# Altium footprint library 6-Connectors-3.PcbLib: 153 footprints (part 1 of 11)
Each footprint in its own frame and in the unit in brackets; x right, y up, seen from the top. Pads: shape width x height; smd on the part's side, far side on the other; paste and mask are expansions set on the pad; w line width, h text height; cw(c..) or ccw(c..) is an arc to the next point about the centre after c.
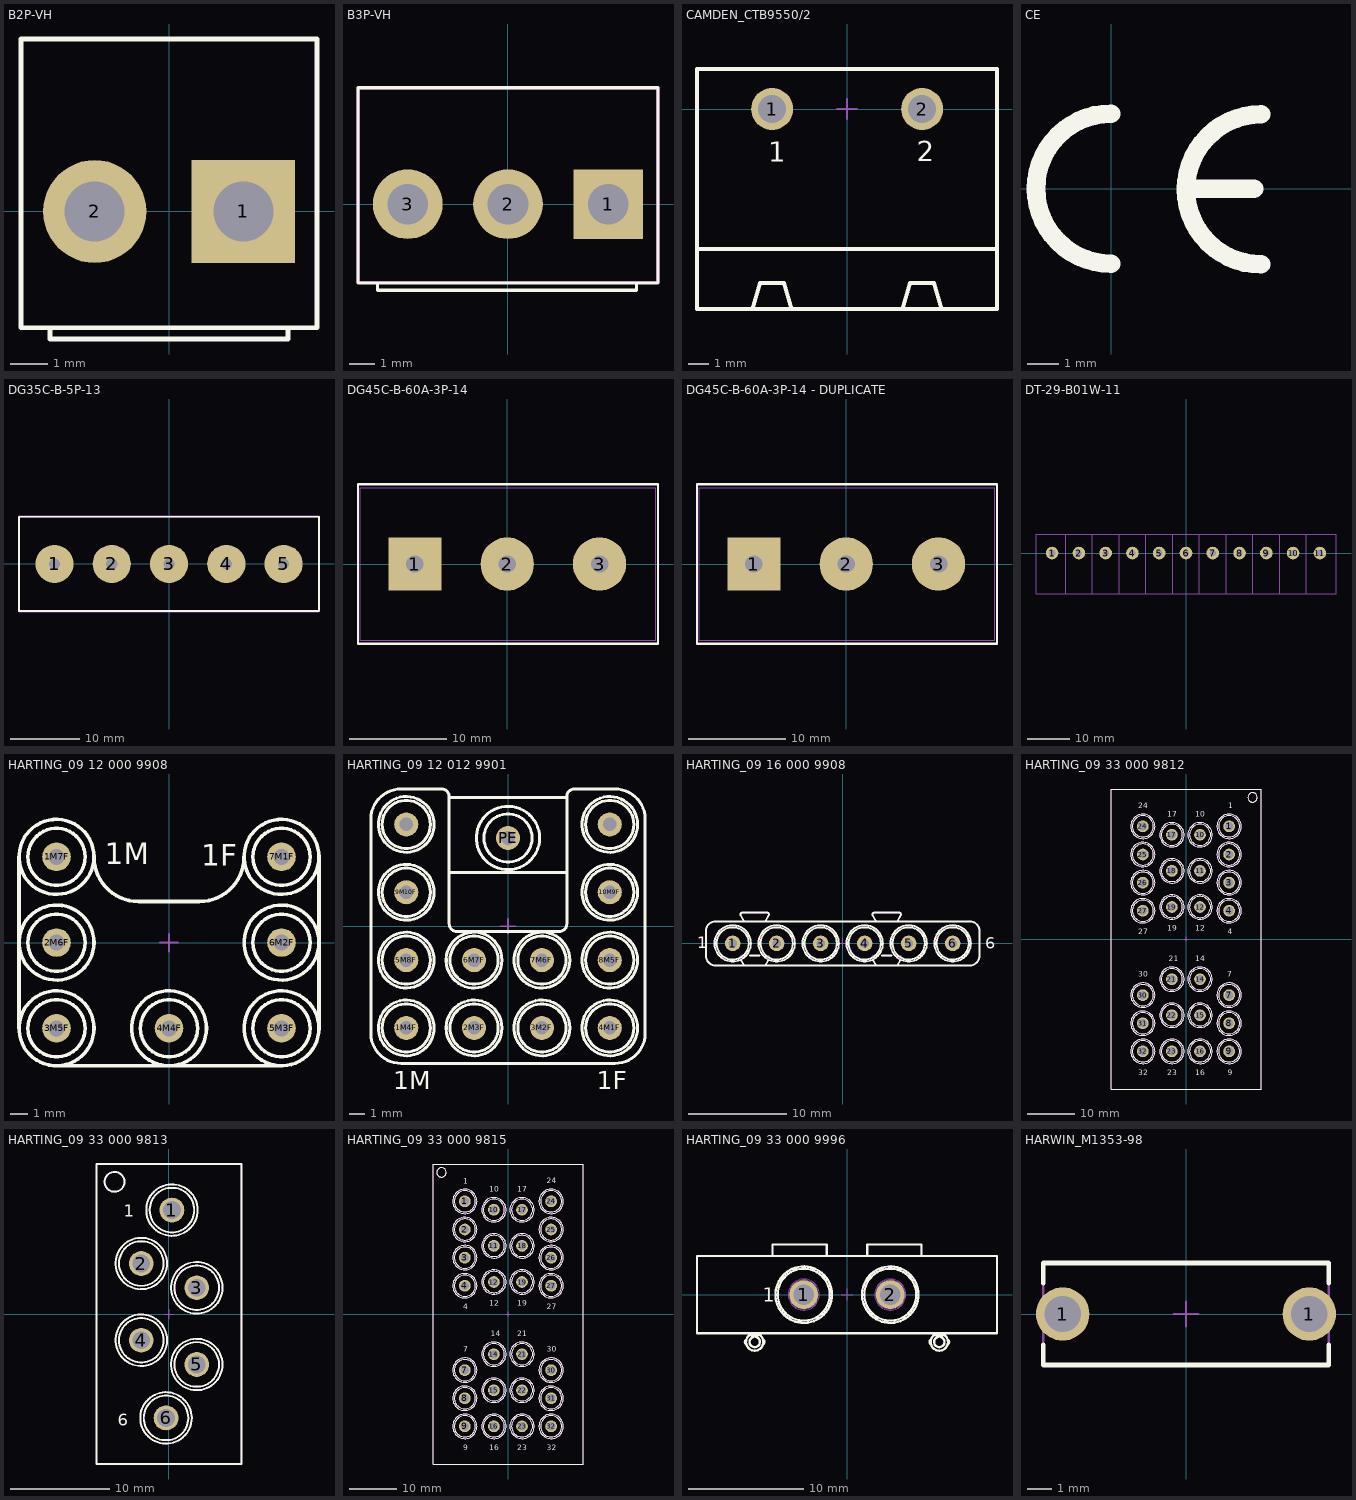
[diagram p0: the footprints below, top view; thin cyan lines are the x and y axes]

## B2P-VH [mm] "VH Connector"
height 14.6
pads (2):
  rect 2.75x2.75 hole 1.6: 1(1.98,0)
  round 2.75 hole 1.6: 2(-1.98,0)
Top Overlay:
  lines w0.127: -3.175,-3.1 -3.175,-3.4 3.175,-3.4 3.175,-3.1 ; -3.95,-3.1 -3.95,4.6 3.95,4.6 3.95,-3.1 -3.95,-3.1
3D body "b2p-vh.stp": height 10.9, standoff -3.5, extent -3.9,-4.15 3.96,4.95

## B3P-VH [mm]
height 14.6
pads (3):
  rect 2.75x2.75 hole 1.6: 1(3.96,0)
  round 2.75 hole 1.6: 2(0,0) 3(-3.96,0)
Top Overlay:
  lines w0.127: -5.155,-3.118 -5.155,-3.4 5.08,-3.4 5.08,-3.118 ; -5.925,-3.118 5.925,-3.118 5.925,4.6 -5.925,4.6 -5.925,-3.118
Mechanical 15:
  lines w0.127: -5.918,-3.093 5.918,-3.093 5.918,4.6 -5.918,4.6 -5.918,-3.042
3D body "b3p-vh.stp": height 10.2, standoff -3.5, extent -5.91,-4.15 5.91,4.95

## CAMDEN_CTB9550/2 [mm] "12A, 750V, Pitch: 7.5mm, 2 Positions, Horizontal  Male Terminal Block"
height 8.3
pads (2):
  round 2.1 hole 1.4: 1(-3.75,0) 2(3.75,0)
Top Overlay:
  lines w0.2: -7.505,-7 7.495,-7 ; -4.73,-10 -4.36,-8.7 -3.15,-8.7 -2.78,-10 ; 2.77,-10 3.14,-8.7 4.35,-8.7 4.72,-10 ; -7.505,-10 7.495,-10 7.495,2 -7.505,2 -7.505,-10
  text "1" at -3.95,-2.65 h1
  text "2" at 3.49,-2.625 h1
Mechanical 8:
  lines w0.1: -4.25,0 -3.75,0 ; -3.75,-0.5 -3.75,0 ; -3.75,0.5 -3.75,0 ; -3.25,0 -3.75,0 ; -0.5,0 0,0 ; 0,-0.5 0,0 ; 0,0.5 0,0 ; 0.5,0 0,0 ; 3.25,0 3.75,0 ; 3.75,-0.5 3.75,0 ; 3.75,0.5 3.75,0 ; 4.25,0 3.75,0
Mechanical 14:
  lines w0.1: -7.505,-7 7.495,-7 ; -4.73,-10 -4.36,-8.7 -3.15,-8.7 -2.78,-10 ; 2.77,-10 3.14,-8.7 4.35,-8.7 4.72,-10 ; -7.505,-10 7.495,-10 7.495,2 -7.505,2 -7.505,-10
  text "1" at -3.95,-2.65 h1
  text "2" at 3.49,-2.625 h1
3D body "CAMDEN_CTB9550-2.stp": height 8.3, standoff -3.5, extent -7.505,-10 7.495,2

## CE [mm]
Top Overlay:
  lines w0.6: 0,-2.413 cw(c0,0) 0,2.413 ; 2.53,0 4.6,0 ; 4.826,-2.438 cw(c4.826,-0.025) 4.826,2.388
3D body "ce.stp": height 0.02, standoff 0, extent -2.725,-2.725 4.82,2.725

## DG35C-B-5P-13 [mm]
height 11
pads (5):
  round 5.5 hole 1.6: 1(-16.5,0) 2(-8.25,0) 3(0,0) 4(8.25,0) 5(16.5,0)
Top Overlay:
  lines w0.254: -21.6,-6.8 -21.6,6.8 21.6,6.8 21.6,-6.8 -21.6,-6.8
Mechanical 15:
  lines w0.127: -21.615,6.833 21.59,6.833 ; -21.59,-6.858 21.565,-6.858 21.565,6.756 ; -21.59,-6.807 -21.59,6.833
  lines w0.254: -21.615,-6.807 -21.615,6.833 ; -21.59,6.833 21.59,6.833
3D body "dg35c.stp": height 15.5, standoff -3.5, extent 11.6,-6.7 21.4,6.7
3D body "dg35c.stp": height 15.5, standoff -3.5, extent 3.35,-6.7 13.15,6.7
3D body "dg35c.stp": height 15.5, standoff -3.5, extent -4.9,-6.7 4.9,6.7
3D body "dg35c.stp": height 15.5, standoff -3.5, extent -13.15,-6.7 -3.35,6.7
3D body "dg35c.stp": height 15.5, standoff -3.5, extent -21.4,-6.7 -11.6,6.7

## DG45C-B-60A-3P-14 [mm]
height 11
pads (3):
  rect 5.5x5.5 hole 1.8: 1(-9.5,0)
  round 5.5 hole 1.8: 2(0,0) 3(9.5,0)
Top Overlay:
  lines w0.254: -15.367,-8.2 -15.367,8.2 15.519,8.2 15.519,-8.2 -15.367,-8.2
Mechanical 15:
  lines w0.127: -15.138,-7.899 -15.138,7.874 15.24,7.874 ; -15.138,-7.849 15.265,-7.849 15.265,7.874
3D body "dg45.stp": height 18, standoff -3.5, extent 3.925,-7.9 15.125,7.9
3D body "dg45.stp": height 18, standoff -3.5, extent -5.6,-7.9 5.6,7.9
3D body "dg45.stp": height 18, standoff -3.5, extent -15.125,-7.9 -3.925,7.9

## DG45C-B-60A-3P-14 - DUPLICATE [mm]
height 11
pads (3):
  rect 5.5x5.5 hole 1.8: 1(-9.5,0)
  round 5.5 hole 1.8: 2(0,0) 3(9.5,0)
Top Overlay:
  lines w0.254: -15.367,-8.2 15.519,-8.2 15.519,8.2 -15.367,8.2 -15.367,-8.2
Mechanical 15:
  lines w0.127: -15.138,-7.899 -15.138,7.874 15.24,7.874 ; -15.138,-7.849 15.265,-7.849 15.265,7.874
3D body "dg45.stp": height 18, standoff -3.5, extent -15.125,-7.9 -3.925,7.9
3D body "dg45.stp": height 18, standoff -3.5, extent -5.6,-7.9 5.6,7.9
3D body "dg45.stp": height 18, standoff -3.5, extent 3.925,-7.9 15.125,7.9

## DT-29-B01W-11 [mm]
height 17.8
pads (11):
  round 3 hole 1.5 mask+0.07: 1(-31.75,0) 2(-25.4,0) 3(-19.05,0) 4(-12.7,0) 5(-6.35,0) 6(0,0) 7(6.35,0) 8(12.7,0) 9(19.05,0) 10(25.4,0) 11(31.75,0)
Mechanical 15:
  lines w0.254: -35.575,-9.598 -35.575,4.402 ; -35.56,-9.598 35.575,-9.598 35.575,4.402 -35.56,4.402 ; -28.575,-9.598 -28.575,4.402 ; -22.225,-9.598 -22.225,4.402 ; -15.875,-9.598 -15.875,4.402 ; -9.525,-9.598 -9.525,4.402 ; -3.175,-9.598 -3.175,4.402 ; 3.175,-9.598 3.175,4.402 ; 9.525,-9.598 9.525,4.402 ; 15.875,-9.598 15.875,4.402 ; 22.225,-9.598 22.225,4.402 ; 28.575,-9.598 28.575,4.402
3D body "dt-29-b01w-11.stp": height 12.7, standoff 0, extent -35.522,-9.71 35.628,4.29

## HARTING_09 12 000 9908 [mm] "7 Positions, PC Board Adaptor For Han Q7/0?Module (PCB Thickness up to 2.4 mm)"
height 23
pads (7):
  round 1.6 hole 0.9: 1M7F(-6.3,4.8) 2M6F(-6.3,0) 3M5F(-6.3,-4.8) 4M4F(0,-4.8) 5M3F(6.3,-4.8) 6M2F(6.3,0) 7M1F(6.3,4.8)
Top Overlay:
  circle w0.2: c-6.3,4.8 r2.1
  circle w0.2: c-6.3,-4.8 r2.1
  circle w0.2: c6.3,-4.8 r2.1
  circle w0.2: c6.3,4.8 r2.1
  circle w0.2: c6.3,0 r2.1
  circle w0.2: c6.3,-4.8 r1.6
  circle w0.2: c6.3,0 r1.6
  circle w0.2: c6.3,4.8 r1.6
  circle w0.2: c-6.3,4.8 r1.6
  circle w0.2: c-6.3,0 r1.6
  circle w0.2: c-6.3,-4.8 r1.6
  circle w0.2: c0,-4.8 r1.6
  circle w0.2: c0,-4.8 r2.1
  circle w0.2: c-6.3,0 r2.1
  lines w0.2: -8.4,-4.8 -8.4,4.8 ; -6.3,-6.9 6.3,-6.9 ; -4.2,4.8 ccw(c-1.7,4.8) -1.699,2.3 1.7,2.301 ; 1.7,2.301 ccw(c1.7,4.801) 4.2,4.8 ; 8.4,-4.8 8.4,4.799
  text "1M" at -3.6,4.4 h1.2
  text "1F" at 1.8,4.3 h1.2
Mechanical 8:
  lines w0.1: -6.8,-4.8 -6.3,-4.8 ; -6.8,0 -6.3,0 ; -6.8,4.8 -6.3,4.8 ; -6.3,-5.3 -6.3,-4.8 ; -6.3,-4.3 -6.3,-4.8 ; -6.3,-0.5 -6.3,0 ; -6.3,0.5 -6.3,0 ; -6.3,4.3 -6.3,4.8 ; -6.3,5.3 -6.3,4.8 ; -5.8,-4.8 -6.3,-4.8 ; -5.8,0 -6.3,0 ; -5.8,4.8 -6.3,4.8 ; -0.5,-4.8 0,-4.8 ; -0.5,0 0,0 ; 0,-5.3 0,-4.8 ; 0,-4.3 0,-4.8 ; 0,-0.5 0,0 ; 0,0.5 0,0 ; 0.5,-4.8 0,-4.8 ; 0.5,0 0,0 ; 5.8,-4.8 6.3,-4.8 ; 5.8,0 6.3,0 ; 5.8,4.8 6.3,4.8 ; 6.3,-5.3 6.3,-4.8 ; 6.3,-4.3 6.3,-4.8 ; 6.3,-0.5 6.3,0 ; 6.3,0.5 6.3,0 ; 6.3,4.3 6.3,4.8 ; 6.3,5.3 6.3,4.8 ; 6.8,-4.8 6.3,-4.8 ; 6.8,0 6.3,0 ; 6.8,4.8 6.3,4.8
Mechanical 14:
  circle w0.1: c-6.3,4.8 r2.1
  circle w0.1: c-6.3,-4.8 r2.1
  circle w0.1: c6.3,-4.8 r2.1
  circle w0.1: c6.3,4.8 r2.1
  circle w0.1: c6.3,0 r2.1
  circle w0.1: c6.3,-4.8 r0.6
  circle w0.1: c6.3,-4.8 r1.6
  circle w0.1: c6.3,0 r0.6
  circle w0.1: c6.3,0 r1.6
  circle w0.1: c6.3,4.8 r0.6
  circle w0.1: c6.3,4.8 r1.6
  circle w0.1: c-6.3,4.8 r0.6
  circle w0.1: c-6.3,4.8 r1.6
  circle w0.1: c-6.3,0 r0.6
  circle w0.1: c-6.3,0 r1.6
  circle w0.1: c-6.3,-4.8 r0.6
  circle w0.1: c-6.3,-4.8 r1.6
  circle w0.1: c0,-4.8 r0.6
  circle w0.1: c0,-4.8 r1.6
  circle w0.1: c0,-4.8 r2.1
  circle w0.1: c-6.3,0 r2.1
  lines w0.1: -8.4,-4.8 -8.4,4.8 ; -6.3,-6.9 6.3,-6.9 ; -4.2,4.8 ccw(c-1.7,4.8) -1.699,2.3 1.7,2.301 ; 1.7,2.301 ccw(c1.7,4.801) 4.2,4.8 ; 8.4,-4.8 8.4,4.799
  text "1M" at -3.6,4.4 h1.2
  text "1F" at 1.8,4.3 h1.2
3D body "HARTING_09 12 000 9908.stp": height 15.9, standoff -3.4, extent -8.4,-6.9 8.4,6.9

## HARTING_09 12 012 9901 [mm] "12 Positions + PE, PC Board Adaptor For Han Q12/0?Module (PCB Thickness up to 2.4 mm)"
height 14.65
pads (13):
  round 1.6 hole 0.9: 1M4F(-6.75,-6.75) 2M3F(-2.25,-6.75) 3M2F(2.25,-6.75) 4M1F(6.75,-6.75) 5M8F(-6.75,-2.25) 6M7F(-2.25,-2.25) 7M6F(2.25,-2.25) 8M5F(6.75,-2.25) 9M10F(-6.75,2.25) 10M9F(6.75,2.25) 11M12F(-6.75,6.75) 12M11F(6.75,6.75) PE(0,5.85)
Top Overlay:
  circle w0.2: c6.75,-6.75 r1.6
  circle w0.2: c6.75,-6.75 r1.85
  circle w0.2: c2.25,-6.75 r1.6
  circle w0.2: c2.25,-6.75 r1.85
  circle w0.2: c-2.25,-6.75 r1.6
  circle w0.2: c-2.25,-6.75 r1.85
  circle w0.2: c-6.75,-6.75 r1.6
  circle w0.2: c-6.75,-6.75 r1.85
  circle w0.2: c-6.75,-2.25 r1.6
  circle w0.2: c-6.75,-2.25 r1.85
  circle w0.2: c-2.25,-2.25 r1.6
  circle w0.2: c-2.25,-2.25 r1.85
  circle w0.2: c2.25,-2.25 r1.6
  circle w0.2: c2.25,-2.25 r1.85
  circle w0.2: c6.75,-2.25 r1.6
  circle w0.2: c6.75,-2.25 r1.85
  circle w0.2: c-6.75,2.25 r1.6
  circle w0.2: c-6.75,2.25 r1.85
  circle w0.2: c-6.75,6.75 r1.6
  circle w0.2: c-6.75,6.75 r1.85
  circle w0.2: c6.75,6.75 r1.6
  circle w0.2: c6.75,6.75 r1.85
  circle w0.2: c6.75,2.25 r1.6
  circle w0.2: c6.75,2.25 r1.85
  circle w0.2: c0,5.85 r1.6
  circle w0.2: c0,5.85 r2.1
  lines w0.2: -3.9,3.55 3.9,3.55 ; -3.9,8.55 3.9,8.55 ; -9.1,-7.1 ccw(c-7.1,-7.1) -7.1,-9.1 7.1,-9.1 ccw(c7.1,-7.1) 9.1,-7.1 9.1,7.1 ccw(c7.1,7.1) 7.1,9.1 4.4,9.1 ccw(c4.4,8.6) 3.9,8.6 3.9,0.15 cw(c3.4,0.15) 3.4,-0.35 -3.4,-0.35 cw(c-3.4,0.15) -3.9,0.15 -3.9,8.6 ccw(c-4.4,8.6) -4.4,9.1 -7.1,9.1 ccw(c-7.1,7.1) -9.1,7.1 -9.1,-7.1
  text "1F" at 5.9,-10.8 h1.2
  text "1M" at -7.6,-10.8 h1.2
Mechanical 8:
  lines w0.1: -7.25,-6.75 -6.75,-6.75 ; -7.25,-2.25 -6.75,-2.25 ; -7.25,2.25 -6.75,2.25 ; -7.25,6.75 -6.75,6.75 ; -6.75,-7.25 -6.75,-6.75 ; -6.75,-6.25 -6.75,-6.75 ; -6.75,-2.75 -6.75,-2.25 ; -6.75,-1.75 -6.75,-2.25 ; -6.75,1.75 -6.75,2.25 ; -6.75,2.75 -6.75,2.25 ; -6.75,6.25 -6.75,6.75 ; -6.75,7.25 -6.75,6.75 ; -6.25,-6.75 -6.75,-6.75 ; -6.25,-2.25 -6.75,-2.25 ; -6.25,2.25 -6.75,2.25 ; -6.25,6.75 -6.75,6.75 ; -2.75,-6.75 -2.25,-6.75 ; -2.75,-2.25 -2.25,-2.25 ; -2.25,-7.25 -2.25,-6.75 ; -2.25,-6.25 -2.25,-6.75 ; -2.25,-2.75 -2.25,-2.25 ; -2.25,-1.75 -2.25,-2.25 ; -1.75,-6.75 -2.25,-6.75 ; -1.75,-2.25 -2.25,-2.25 ; -0.5,0 0,0 ; -0.5,5.85 0,5.85 ; 0,-0.5 0,0 ; 0,0.5 0,0 ; 0,5.35 0,5.85 ; 0,6.35 0,5.85 ; 0.5,0 0,0 ; 0.5,5.85 0,5.85 ; 1.75,-6.75 2.25,-6.75 ; 1.75,-2.25 2.25,-2.25 ; 2.25,-7.25 2.25,-6.75 ; 2.25,-6.25 2.25,-6.75 ; 2.25,-2.75 2.25,-2.25 ; 2.25,-1.75 2.25,-2.25 ; 2.75,-6.75 2.25,-6.75 ; 2.75,-2.25 2.25,-2.25 ; 6.25,-6.75 6.75,-6.75 ; 6.25,-2.25 6.75,-2.25 ; 6.25,2.25 6.75,2.25 ; 6.25,6.75 6.75,6.75 ; 6.75,-7.25 6.75,-6.75 ; 6.75,-6.25 6.75,-6.75 ; 6.75,-2.75 6.75,-2.25 ; 6.75,-1.75 6.75,-2.25 ; 6.75,1.75 6.75,2.25 ; 6.75,2.75 6.75,2.25 ; 6.75,6.25 6.75,6.75 ; 6.75,7.25 6.75,6.75 ; 7.25,-6.75 6.75,-6.75 ; 7.25,-2.25 6.75,-2.25 ; 7.25,2.25 6.75,2.25 ; 7.25,6.75 6.75,6.75
Mechanical 14:
  circle w0.1: c6.75,-6.75 r0.6
  circle w0.1: c6.75,-6.75 r1.6
  circle w0.1: c6.75,-6.75 r1.85
  circle w0.1: c2.25,-6.75 r0.6
  circle w0.1: c2.25,-6.75 r1.6
  circle w0.1: c2.25,-6.75 r1.85
  circle w0.1: c-2.25,-6.75 r0.6
  circle w0.1: c-2.25,-6.75 r1.6
  circle w0.1: c-2.25,-6.75 r1.85
  circle w0.1: c-6.75,-6.75 r0.6
  circle w0.1: c-6.75,-6.75 r1.6
  circle w0.1: c-6.75,-6.75 r1.85
  circle w0.1: c-6.75,-2.25 r0.6
  circle w0.1: c-6.75,-2.25 r1.6
  circle w0.1: c-6.75,-2.25 r1.85
  circle w0.1: c-2.25,-2.25 r0.6
  circle w0.1: c-2.25,-2.25 r1.6
  circle w0.1: c-2.25,-2.25 r1.85
  circle w0.1: c2.25,-2.25 r0.6
  circle w0.1: c2.25,-2.25 r1.6
  circle w0.1: c2.25,-2.25 r1.85
  circle w0.1: c6.75,-2.25 r0.6
  circle w0.1: c6.75,-2.25 r1.6
  circle w0.1: c6.75,-2.25 r1.85
  circle w0.1: c-6.75,2.25 r0.6
  circle w0.1: c-6.75,2.25 r1.6
  circle w0.1: c-6.75,2.25 r1.85
  circle w0.1: c-6.75,6.75 r0.6
  circle w0.1: c-6.75,6.75 r1.6
  circle w0.1: c-6.75,6.75 r1.85
  circle w0.1: c6.75,6.75 r0.6
  circle w0.1: c6.75,6.75 r1.6
  circle w0.1: c6.75,6.75 r1.85
  circle w0.1: c6.75,2.25 r0.6
  circle w0.1: c6.75,2.25 r1.6
  circle w0.1: c6.75,2.25 r1.85
  circle w0.1: c0,5.85 r0.6
  circle w0.1: c0,5.85 r1.6
  circle w0.1: c0,5.85 r2.1
  lines w0.1: -3.9,3.55 3.9,3.55 ; -3.9,8.55 3.9,8.55 ; -9.1,-7.1 ccw(c-7.1,-7.1) -7.1,-9.1 7.1,-9.1 ccw(c7.1,-7.1) 9.1,-7.1 9.1,7.1 ccw(c7.1,7.1) 7.1,9.1 4.4,9.1 ccw(c4.4,8.6) 3.9,8.6 3.9,0.15 cw(c3.4,0.15) 3.4,-0.35 -3.4,-0.35 cw(c-3.4,0.15) -3.9,0.15 -3.9,8.6 ccw(c-4.4,8.6) -4.4,9.1 -7.1,9.1 ccw(c-7.1,7.1) -9.1,7.1 -9.1,-7.1
  text "1F" at 5.9,-10.8 h1.2
  text "1M" at -7.6,-10.8 h1.2
3D body "HARTING_09 12 012 9901.stp": height 14.65, standoff -3.65, extent -9.1,-9.1 9.1,9.1

## HARTING_09 16 000 9908 [mm] "6 Positions, PC Board Adaptor For Han DD?Module (PCB Thickness up to 2.4 mm)"
height 15.9
pads (6):
  round 1.6 hole 0.9: 1(-11.25,0) 2(-6.75,0) 3(-2.25,0) 4(2.25,0) 5(6.75,0) 6(11.25,0)
Top Overlay:
  circle w0.2: c11.25,0 r1.861
  circle w0.2: c11.25,0 r1.65
  circle w0.2: c6.75,0 r1.861
  circle w0.2: c6.75,0 r1.65
  circle w0.2: c2.25,0 r1.861
  circle w0.2: c2.25,0 r1.65
  circle w0.2: c-2.25,0 r1.861
  circle w0.2: c-2.25,0 r1.65
  circle w0.2: c-6.75,0 r1.861
  circle w0.2: c-11.25,0 r1.861
  circle w0.2: c-11.25,0 r1.65
  circle w0.2: c-6.75,0 r1.65
  lines w0.2: -10.379,-1.75 -10.09,-2.25 ; -10.08,2.25 -10.426,2.85 cw(c-10.253,2.95) -10.253,3.15 -7.747,3.15 cw(c-7.747,2.95) -7.574,2.85 -7.92,2.25 ; -9.5,-1.25 -8.5,-1.25 ; -7.91,-2.25 -7.621,-1.75 ; 3.121,-1.75 3.41,-2.25 ; 3.42,2.25 3.074,2.85 cw(c3.247,2.95) 3.247,3.15 5.753,3.15 cw(c5.753,2.95) 5.926,2.85 5.58,2.25 ; 4,-1.25 5,-1.25 ; 5.59,-2.25 5.879,-1.75 ; -14,-1.25 ccw(c-13,-1.25) -13,-2.25 13,-2.25 ccw(c13,-1.25) 14,-1.25 14,1.25 ccw(c13,1.25) 13,2.25 -13,2.25 ccw(c-13,1.25) -14,1.25 -14,-1.25
  text "6" at 14.585,-0.527 h1.2
  text "1" at -14.9,-0.5 h1.2
Mechanical 8:
  lines w0.1: -11.75,0 -11.25,0 ; -11.25,-0.5 -11.25,0 ; -11.25,0.5 -11.25,0 ; -10.75,0 -11.25,0 ; -7.25,0 -6.75,0 ; -6.75,-0.5 -6.75,0 ; -6.75,0.5 -6.75,0 ; -6.25,0 -6.75,0 ; -2.75,0 -2.25,0 ; -2.25,-0.5 -2.25,0 ; -2.25,0.5 -2.25,0 ; -1.75,0 -2.25,0 ; -0.5,0 0,0 ; 0,-0.5 0,0 ; 0,0.5 0,0 ; 0.5,0 0,0 ; 1.75,0 2.25,0 ; 2.25,-0.5 2.25,0 ; 2.25,0.5 2.25,0 ; 2.75,0 2.25,0 ; 6.25,0 6.75,0 ; 6.75,-0.5 6.75,0 ; 6.75,0.5 6.75,0 ; 7.25,0 6.75,0 ; 10.75,0 11.25,0 ; 11.25,-0.5 11.25,0 ; 11.25,0.5 11.25,0 ; 11.75,0 11.25,0
Mechanical 14:
  circle w0.1: c11.25,0 r1.861
  circle w0.1: c11.25,0 r1.65
  circle w0.1: c11.25,0 r0.6
  circle w0.1: c6.75,0 r1.861
  circle w0.1: c6.75,0 r1.65
  circle w0.1: c6.75,0 r0.6
  circle w0.1: c2.25,0 r1.861
  circle w0.1: c2.25,0 r1.65
  circle w0.1: c2.25,0 r0.6
  circle w0.1: c-2.25,0 r1.861
  circle w0.1: c-2.25,0 r1.65
  circle w0.1: c-2.25,0 r0.6
  circle w0.1: c-6.75,0 r1.861
  circle w0.1: c-6.75,0 r1.65
  circle w0.1: c-6.75,0 r0.6
  circle w0.1: c-11.25,0 r1.861
  circle w0.1: c-11.25,0 r1.65
  circle w0.1: c-11.25,0 r0.6
  lines w0.1: -10.494,-1.55 cw(c-10.321,-1.45) -10.321,-1.25 -10,-1.25 ; -10.379,-1.75 -10.09,-2.25 ; -10.08,2.25 -10.426,2.85 cw(c-10.253,2.95) -10.253,3.15 -7.747,3.15 cw(c-7.747,2.95) -7.574,2.85 -7.92,2.25 ; -9.5,-1.25 -8.5,-1.25 ; -8,-1.25 -7.679,-1.25 cw(c-7.679,-1.45) -7.506,-1.55 ; -7.91,-2.25 -7.621,-1.75 ; 3.006,-1.55 cw(c3.179,-1.45) 3.179,-1.25 3.5,-1.25 ; 3.121,-1.75 3.41,-2.25 ; 3.42,2.25 3.074,2.85 cw(c3.247,2.95) 3.247,3.15 5.753,3.15 cw(c5.753,2.95) 5.926,2.85 5.58,2.25 ; 4,-1.25 5,-1.25 ; 5.5,-1.25 5.821,-1.25 cw(c5.821,-1.45) 5.994,-1.55 ; 5.59,-2.25 5.879,-1.75 ; -14,-1.25 ccw(c-13,-1.25) -13,-2.25 13,-2.25 ccw(c13,-1.25) 14,-1.25 14,1.25 ccw(c13,1.25) 13,2.25 -13,2.25 ccw(c-13,1.25) -14,1.25 -14,-1.25
  text "1" at -14.9,-0.5 h1.2
  text "6" at 14.585,-0.527 h1.2
3D body "HARTING_09 16 000 9908.stp": height 15.9, standoff -3.3, extent -14,-2.25 14,3.15

## HARTING_09 33 000 9812 [mm] "Han 32EE-f PCB Matrix With Contacts"
height 26
pads (26):
  round 2.5 hole 1.8: 1(9.193,24.026) 2(9.193,18.026) 3(9.193,12.026) 4(9.193,6.026) 7(9.193,-11.974) 8(9.193,-17.974) 9(9.193,-23.974) 10(2.993,22.226) 11(2.993,14.526) 12(2.993,6.826) 14(2.993,-8.574) 15(2.993,-16.274) 16(2.993,-23.974) 17(-3.007,22.226) 18(-3.007,14.526) 19(-3.007,6.826) 21(-3.007,-8.574) 22(-3.007,-16.274) 23(-3.007,-23.974) 24(-9.207,24.026) 25(-9.207,18.026) 26(-9.207,12.026) 27(-9.207,6.026) 30(-9.207,-11.974) 31(-9.207,-17.974) 32(-9.207,-23.974)
Top Overlay:
  circle w0.2: c14.2,30.2 r1
  circle w0.2: c-9.207,18.026 r2.6
  circle w0.2: c-9.207,18.026 r2.25
  circle w0.2: c-9.207,-23.974 r2.6
  circle w0.2: c-9.207,-17.974 r2.6
  circle w0.2: c-9.207,-11.974 r2.6
  circle w0.2: c-3.007,-8.574 r2.6
  circle w0.2: c-3.007,-16.274 r2.6
  circle w0.2: c-3.007,-23.974 r2.6
  circle w0.2: c2.993,-23.974 r2.6
  circle w0.2: c2.993,-16.274 r2.6
  circle w0.2: c9.193,-23.974 r2.6
  circle w0.2: c9.193,-17.974 r2.6
  circle w0.2: c9.193,-11.974 r2.6
  circle w0.2: c2.993,-8.574 r2.6
  circle w0.2: c-9.207,6.026 r2.6
  circle w0.2: c-3.007,6.826 r2.6
  circle w0.2: c-9.207,12.026 r2.6
  circle w0.2: c-3.007,14.526 r2.6
  circle w0.2: c2.993,14.526 r2.6
  circle w0.2: c2.993,6.826 r2.6
  circle w0.2: c9.193,6.026 r2.6
  circle w0.2: c9.193,12.026 r2.6
  circle w0.2: c9.193,18.026 r2.6
  circle w0.2: c9.193,24.026 r2.6
  circle w0.2: c2.993,22.226 r2.6
  circle w0.2: c-3.007,22.226 r2.6
  circle w0.2: c-9.207,24.026 r2.6
  circle w0.2: c-9.207,24.026 r2.25
  circle w0.2: c-3.007,22.226 r2.25
  circle w0.2: c2.993,22.226 r2.25
  circle w0.2: c9.193,24.026 r2.25
  circle w0.2: c9.193,18.026 r2.25
  circle w0.2: c2.993,14.526 r2.25
  circle w0.2: c9.193,12.026 r2.25
  circle w0.2: c-3.007,14.526 r2.25
  circle w0.2: c-9.207,12.026 r2.25
  circle w0.2: c-9.207,6.026 r2.25
  circle w0.2: c-3.007,6.826 r2.25
  circle w0.2: c2.993,6.826 r2.25
  circle w0.2: c9.193,6.026 r2.25
  circle w0.2: c2.993,-8.574 r2.25
  circle w0.2: c-3.007,-8.574 r2.25
  circle w0.2: c-9.207,-11.974 r2.25
  circle w0.2: c9.193,-11.974 r2.25
  circle w0.2: c9.193,-17.974 r2.25
  circle w0.2: c2.993,-16.274 r2.25
  circle w0.2: c-3.007,-16.274 r2.25
  circle w0.2: c-9.207,-17.974 r2.25
  circle w0.2: c-9.207,-23.974 r2.25
  circle w0.2: c-3.007,-23.974 r2.25
  circle w0.2: c2.993,-23.974 r2.25
  circle w0.2: c9.193,-23.974 r2.25
  lines w0.2: -16,-32 -16,32 16,32 16,-32 -16,-32
  text "32" at -10.175,-29.026 h1.2
  text "30" at -10.175,-8.101 h1.2
  text "27" at -10.175,0.974 h1.2
  text "24" at -10.175,27.899 h1.2
  text "1" at 9.05,27.899 h1.2
  text "14" at 2.025,-4.701 h1.2
  text "21" at -3.725,-4.701 h1.2
  text "19" at -3.975,1.774 h1.2
  text "12" at 2.025,1.774 h1.2
  text "17" at -3.975,26.099 h1.2
  text "10" at 2.025,26.099 h1.2
  text "16" at 2.025,-29.026 h1.2
  text "23" at -3.975,-29.026 h1.2
  text "4" at 8.875,0.974 h1.2
  text "7" at 8.825,-8.101 h1.2
  text "9" at 8.875,-29.026 h1.2
Bottom Overlay:
  text "32" at -8.3,-29.026 h1.2
  text "30" at -8.45,-8.125 h1.2
  text "27" at -8.55,0.974 h1.2
  text "24" at -8.225,27.899 h1.2
  text "1" at 9.35,27.899 h1.2
  text "23" at -2.075,-29.026 h1.2
  text "16" at 3.65,-29.026 h1.2
  text "10" at 3.975,26.099 h1.2
  text "17" at -2.025,26.099 h1.2
  text "12" at 3.675,1.774 h1.2
  text "19" at -2.35,1.774 h1.2
  text "21" at -2.25,-4.675 h1.2
  text "14" at 3.75,-4.725 h1.2
  text "4" at 9.75,0.949 h1.2
  text "7" at 9.6,-8.125 h1.2
  text "9" at 9.625,-29.026 h1.2
Mechanical 8:
  lines w0.1: -9.707,-23.974 -9.207,-23.974 ; -9.707,-17.974 -9.207,-17.974 ; -9.707,-11.974 -9.207,-11.974 ; -9.707,6.026 -9.207,6.026 ; -9.707,12.026 -9.207,12.026 ; -9.707,18.026 -9.207,18.026 ; -9.707,24.026 -9.207,24.026 ; -9.207,-24.474 -9.207,-23.974 ; -9.207,-23.474 -9.207,-23.974 ; -9.207,-18.474 -9.207,-17.974 ; -9.207,-17.474 -9.207,-17.974 ; -9.207,-12.474 -9.207,-11.974 ; -9.207,-11.474 -9.207,-11.974 ; -9.207,5.526 -9.207,6.026 ; -9.207,6.526 -9.207,6.026 ; -9.207,11.526 -9.207,12.026 ; -9.207,12.526 -9.207,12.026 ; -9.207,17.526 -9.207,18.026 ; -9.207,18.526 -9.207,18.026 ; -9.207,23.526 -9.207,24.026 ; -9.207,24.526 -9.207,24.026 ; -8.707,-23.974 -9.207,-23.974 ; -8.707,-17.974 -9.207,-17.974 ; -8.707,-11.974 -9.207,-11.974 ; -8.707,6.026 -9.207,6.026 ; -8.707,12.026 -9.207,12.026 ; -8.707,18.026 -9.207,18.026 ; -8.707,24.026 -9.207,24.026 ; -3.507,-23.974 -3.007,-23.974 ; -3.507,-16.274 -3.007,-16.274 ; -3.507,-8.574 -3.007,-8.574 ; -3.507,6.826 -3.007,6.826 ; -3.507,14.526 -3.007,14.526 ; -3.507,22.226 -3.007,22.226 ; -3.007,-24.474 -3.007,-23.974 ; -3.007,-23.474 -3.007,-23.974 ; -3.007,-16.774 -3.007,-16.274 ; -3.007,-15.774 -3.007,-16.274 ; -3.007,-9.074 -3.007,-8.574 ; -3.007,-8.074 -3.007,-8.574 ; -3.007,6.326 -3.007,6.826 ; -3.007,7.326 -3.007,6.826 ; -3.007,14.026 -3.007,14.526 ; -3.007,15.026 -3.007,14.526 ; -3.007,21.726 -3.007,22.226 ; -3.007,22.726 -3.007,22.226 ; -2.507,-23.974 -3.007,-23.974 ; -2.507,-16.274 -3.007,-16.274 ; -2.507,-8.574 -3.007,-8.574 ; -2.507,6.826 -3.007,6.826 ; -2.507,14.526 -3.007,14.526 ; -2.507,22.226 -3.007,22.226 ; -0.5,0 0,0 ; 0,-0.5 0,0 ; 0,0.5 0,0 ; 0.5,0 0,0 ; 2.493,-23.974 2.993,-23.974 ; 2.493,-16.274 2.993,-16.274 ; 2.493,-8.574 2.993,-8.574 ; 2.493,6.826 2.993,6.826 ; 2.493,14.526 2.993,14.526 ; 2.493,22.226 2.993,22.226 ; 2.993,-24.474 2.993,-23.974 ; 2.993,-23.474 2.993,-23.974 ; 2.993,-16.774 2.993,-16.274 ; 2.993,-15.774 2.993,-16.274 ; 2.993,-9.074 2.993,-8.574 ; 2.993,-8.074 2.993,-8.574 ; 2.993,6.326 2.993,6.826 ; 2.993,7.326 2.993,6.826 ; 2.993,14.026 2.993,14.526 ; 2.993,15.026 2.993,14.526 ; 2.993,21.726 2.993,22.226 ; 2.993,22.726 2.993,22.226 ; 3.493,-23.974 2.993,-23.974 ; 3.493,-16.274 2.993,-16.274 ; 3.493,-8.574 2.993,-8.574 ; 3.493,6.826 2.993,6.826 ; 3.493,14.526 2.993,14.526 ; 3.493,22.226 2.993,22.226 ; 8.693,-23.974 9.193,-23.974 ; 8.693,-17.974 9.193,-17.974 ; 8.693,-11.974 9.193,-11.974 ; 8.693,6.026 9.193,6.026 ; 8.693,12.026 9.193,12.026 ; 8.693,18.026 9.193,18.026 ; 8.693,24.026 9.193,24.026 ; 9.193,-24.474 9.193,-23.974 ; 9.193,-23.474 9.193,-23.974 ; 9.193,-18.474 9.193,-17.974 ; 9.193,-17.474 9.193,-17.974 ; 9.193,-12.474 9.193,-11.974 ; 9.193,-11.474 9.193,-11.974 ; 9.193,5.526 9.193,6.026 ; 9.193,6.526 9.193,6.026 ; 9.193,11.526 9.193,12.026 ; 9.193,12.526 9.193,12.026 ; 9.193,17.526 9.193,18.026 ; 9.193,18.526 9.193,18.026 ; 9.193,23.526 9.193,24.026 ; 9.193,24.526 9.193,24.026 ; 9.693,-23.974 9.193,-23.974 ; 9.693,-17.974 9.193,-17.974 ; 9.693,-11.974 9.193,-11.974 ; 9.693,6.026 9.193,6.026 ; 9.693,12.026 9.193,12.026 ; 9.693,18.026 9.193,18.026 ; 9.693,24.026 9.193,24.026
Mechanical 14:
  circle w0.1: c9.193,-11.974 r2.6
  circle w0.1: c9.193,-17.974 r2.6
  circle w0.1: c9.193,-23.974 r2.6
  circle w0.1: c2.993,-23.974 r2.6
  circle w0.1: c2.993,-16.274 r2.6
  circle w0.1: c-3.007,-16.274 r2.6
  circle w0.1: c-3.007,-23.974 r2.6
  circle w0.1: c-9.207,-23.974 r2.6
  circle w0.1: c-9.207,-17.974 r2.6
  circle w0.1: c-9.207,-11.974 r2.6
  circle w0.1: c2.993,-8.574 r2.6
  circle w0.1: c-3.007,-8.574 r2.6
  circle w0.1: c-9.207,6.026 r2.6
  circle w0.1: c-3.007,6.826 r2.6
  circle w0.1: c2.993,6.826 r2.6
  circle w0.1: c9.193,6.026 r2.6
  circle w0.1: c9.193,12.026 r2.6
  circle w0.1: c9.193,24.026 r2.6
  circle w0.1: c9.193,18.026 r2.6
  circle w0.1: c-9.207,12.026 r2.6
  circle w0.1: c2.993,14.526 r2.6
  circle w0.1: c-3.007,14.526 r2.6
  circle w0.1: c2.993,22.226 r2.6
  circle w0.1: c-3.007,22.226 r2.6
  circle w0.1: c14.2,30.2 r1
  circle w0.1: c-9.207,18.026 r2.6
  circle w0.1: c-9.207,18.026 r2.25
  circle w0.1: c-9.207,-23.974 r2.25
  circle w0.1: c-9.207,-17.974 r2.25
  circle w0.1: c-9.207,-11.974 r2.25
  circle w0.1: c-3.007,-8.574 r2.25
  circle w0.1: c-3.007,-16.274 r2.25
  circle w0.1: c-3.007,-23.974 r2.25
  circle w0.1: c2.993,-23.974 r2.25
  circle w0.1: c2.993,-16.274 r2.25
  circle w0.1: c9.193,-23.974 r2.25
  circle w0.1: c9.193,-17.974 r2.25
  circle w0.1: c9.193,-11.974 r2.25
  circle w0.1: c2.993,-8.574 r2.25
  circle w0.1: c-9.207,6.026 r2.25
  circle w0.1: c-3.007,6.826 r2.25
  circle w0.1: c-3.007,14.526 r2.25
  circle w0.1: c2.993,14.526 r2.25
  circle w0.1: c2.993,6.826 r2.25
  circle w0.1: c9.193,6.026 r2.25
  circle w0.1: c9.193,12.026 r2.25
  circle w0.1: c9.193,18.026 r2.25
  circle w0.1: c9.193,24.026 r2.25
  circle w0.1: c2.993,22.226 r2.25
  circle w0.1: c-3.007,22.226 r2.25
  circle w0.1: c-9.207,24.026 r2.6
  circle w0.1: c-9.207,24.026 r2.25
  circle w0.1: c-9.207,12.026 r2.25
  lines w0.1: -16,-32 -16,32 16,32 16,-32 -16,-32
  text "32" at -10.175,-29.026 h1.2
  text "30" at -10.175,-8.101 h1.2
  text "27" at -10.175,0.974 h1.2
  text "24" at -10.175,27.899 h1.2
  text "1" at 9.05,27.899 h1.2
  text "14" at 2.025,-4.701 h1.2
  text "21" at -3.725,-4.701 h1.2
  text "19" at -3.975,1.774 h1.2
  text "12" at 2.025,1.774 h1.2
  text "17" at -3.975,26.099 h1.2
  text "10" at 2.025,26.099 h1.2
  text "16" at 2.025,-29.026 h1.2
  text "23" at -3.975,-29.026 h1.2
  text "4" at 8.875,0.974 h1.2
  text "7" at 8.825,-8.101 h1.2
  text "9" at 8.875,-29.026 h1.2
3D body "HARTING_09 33 000 9812.stp": height 26, standoff -4.6, extent -16,-32 16,32

## HARTING_09 33 000 9813 [mm] "Han 6E-m PCB Matrix With Contacts"
height 26
pads (6):
  round 2.5 hole 1.8: 1(0.3,10.5) 2(-2.8,5.1) 3(2.8,2.65) 4(-2.8,-2.65) 5(2.8,-5.1) 6(-0.3,-10.5)
Top Overlay:
  circle w0.2: c-5.5,13.35 r1
  circle w0.2: c-0.3,-10.5 r2.6
  circle w0.2: c-0.3,-10.5 r2.25
  circle w0.2: c2.8,-5.1 r2.6
  circle w0.2: c2.8,-5.1 r2.25
  circle w0.2: c-2.8,-2.65 r2.6
  circle w0.2: c-2.8,-2.65 r2.25
  circle w0.2: c2.8,2.65 r2.6
  circle w0.2: c2.8,2.65 r2.25
  circle w0.2: c-2.8,5.1 r2.6
  circle w0.2: c-2.8,5.1 r2.25
  circle w0.2: c0.3,10.5 r2.6
  circle w0.2: c0.3,10.5 r2.25
  lines w0.2: -7.3,-15.15 -7.3,15.15 7.3,15.15 7.3,-15.15 -7.3,-15.15
  text "1" at -4.593,9.824 h1.2
  text "6" at -5.193,-11.276 h1.2
Bottom Overlay:
  text "1" at -4.318,9.824 h1.2
  text "6" at -4.418,-11.276 h1.2
Mechanical 8:
  lines w0.1: -3.3,-2.65 -2.8,-2.65 ; -3.3,5.1 -2.8,5.1 ; -2.8,-3.15 -2.8,-2.65 ; -2.8,-2.15 -2.8,-2.65 ; -2.8,4.6 -2.8,5.1 ; -2.8,5.6 -2.8,5.1 ; -2.3,-2.65 -2.8,-2.65 ; -2.3,5.1 -2.8,5.1 ; -0.8,-10.5 -0.3,-10.5 ; -0.5,0 0,0 ; -0.3,-11 -0.3,-10.5 ; -0.3,-10 -0.3,-10.5 ; -0.2,10.5 0.3,10.5 ; 0,-0.5 0,0 ; 0,0.5 0,0 ; 0.2,-10.5 -0.3,-10.5 ; 0.3,10 0.3,10.5 ; 0.3,11 0.3,10.5 ; 0.5,0 0,0 ; 0.8,10.5 0.3,10.5 ; 2.3,-5.1 2.8,-5.1 ; 2.3,2.65 2.8,2.65 ; 2.8,-5.6 2.8,-5.1 ; 2.8,-4.6 2.8,-5.1 ; 2.8,2.15 2.8,2.65 ; 2.8,3.15 2.8,2.65 ; 3.3,-5.1 2.8,-5.1 ; 3.3,2.65 2.8,2.65
Mechanical 14:
  circle w0.1: c-5.5,13.35 r1
  circle w0.1: c-0.3,-10.5 r2.6
  circle w0.1: c-0.3,-10.5 r2.25
  circle w0.1: c2.8,-5.1 r2.6
  circle w0.1: c2.8,-5.1 r2.25
  circle w0.1: c-2.8,-2.65 r2.6
  circle w0.1: c-2.8,-2.65 r2.25
  circle w0.1: c2.8,2.65 r2.6
  circle w0.1: c2.8,2.65 r2.25
  circle w0.1: c-2.8,5.1 r2.6
  circle w0.1: c-2.8,5.1 r2.25
  circle w0.1: c0.3,10.5 r2.6
  circle w0.1: c0.3,10.5 r2.25
  lines w0.1: -7.3,-15.15 -7.3,15.15 7.3,15.15 7.3,-15.15 -7.3,-15.15
  text "1" at -4.593,9.824 h1.2
  text "6" at -5.193,-11.276 h1.2
3D body "HARTING_09 33 000 9813.stp": height 26, standoff -4.6, extent -7.3,-15.15 7.3,15.15

## HARTING_09 33 000 9815 [mm] "Han 32EE-m PCB Matrix With Contacts"
height 26
pads (26):
  round 2.5 hole 1.8: 1(-9.207,24.026) 2(-9.207,18.026) 3(-9.207,12.026) 4(-9.207,6.026) 7(-9.207,-11.974) 8(-9.207,-17.974) 9(-9.207,-23.974) 10(-3.007,22.226) 11(-3.007,14.526) 12(-3.007,6.826) 14(-3.007,-8.574) 15(-3.007,-16.274) 16(-3.007,-23.974) 17(2.993,22.226) 18(2.993,14.526) 19(2.993,6.826) 21(2.993,-8.574) 22(2.993,-16.274) 23(2.993,-23.974) 24(9.193,24.026) 25(9.193,18.026) 26(9.193,12.026) 27(9.193,6.026) 30(9.193,-11.974) 31(9.193,-17.974) 32(9.193,-23.974)
Top Overlay:
  circle w0.2: c9.193,-23.974 r2.25
  circle w0.2: c2.993,-23.974 r2.25
  circle w0.2: c-3.007,-23.974 r2.25
  circle w0.2: c-9.207,-23.974 r2.25
  circle w0.2: c-9.207,-17.974 r2.25
  circle w0.2: c-3.007,-16.274 r2.25
  circle w0.2: c2.993,-16.274 r2.25
  circle w0.2: c9.193,-17.974 r2.25
  circle w0.2: c9.193,-11.974 r2.25
  circle w0.2: c-9.207,-11.974 r2.25
  circle w0.2: c-3.007,-8.574 r2.25
  circle w0.2: c2.993,-8.574 r2.25
  circle w0.2: c9.193,6.026 r2.25
  circle w0.2: c2.993,6.826 r2.25
  circle w0.2: c-3.007,6.826 r2.25
  circle w0.2: c-9.207,6.026 r2.25
  circle w0.2: c-9.207,12.026 r2.25
  circle w0.2: c-3.007,14.526 r2.25
  circle w0.2: c9.193,12.026 r2.25
  circle w0.2: c2.993,14.526 r2.25
  circle w0.2: c9.193,18.026 r2.25
  circle w0.2: c9.193,24.026 r2.25
  circle w0.2: c2.993,22.226 r2.25
  circle w0.2: c-3.007,22.226 r2.25
  circle w0.2: c-9.207,24.026 r2.25
  circle w0.2: c-9.207,24.026 r2.6
  circle w0.2: c-3.007,22.226 r2.6
  circle w0.2: c2.993,22.226 r2.6
  circle w0.2: c9.193,24.026 r2.6
  circle w0.2: c9.193,18.026 r2.6
  circle w0.2: c9.193,12.026 r2.6
  circle w0.2: c9.193,6.026 r2.6
  circle w0.2: c2.993,6.826 r2.6
  circle w0.2: c2.993,14.526 r2.6
  circle w0.2: c-3.007,14.526 r2.6
  circle w0.2: c-9.207,12.026 r2.6
  circle w0.2: c-3.007,6.826 r2.6
  circle w0.2: c-9.207,6.026 r2.6
  circle w0.2: c2.993,-8.574 r2.6
  circle w0.2: c9.193,-11.974 r2.6
  circle w0.2: c9.193,-17.974 r2.6
  circle w0.2: c9.193,-23.974 r2.6
  circle w0.2: c2.993,-16.274 r2.6
  circle w0.2: c2.993,-23.974 r2.6
  circle w0.2: c-3.007,-23.974 r2.6
  circle w0.2: c-3.007,-16.274 r2.6
  circle w0.2: c-3.007,-8.574 r2.6
  circle w0.2: c-9.207,-11.974 r2.6
  circle w0.2: c-9.207,-17.974 r2.6
  circle w0.2: c-9.207,-23.974 r2.6
  circle w0.2: c-9.207,18.026 r2.25
  circle w0.2: c-9.207,18.026 r2.6
  circle w0.2: c-14.2,30.2 r1
  lines w0.2: -16,-32 16,-32 16,32 -16,32 -16,-32
  text "7" at -9.575,-8.101 h1.2
  text "30" at 8.225,-8.101 h1.2
  text "4" at -9.525,0.974 h1.2
  text "27" at 8.225,0.974 h1.2
  text "24" at 8.225,27.899 h1.2
  text "9" at -9.525,-29.026 h1.2
  text "32" at 8.225,-29.026 h1.2
  text "1" at -9.525,27.75 h1.2
  text "16" at -3.975,-29.026 h1.2
  text "23" at 2.025,-29.026 h1.2
  text "17" at 2.025,26.099 h1.2
  text "10" at -3.975,26.099 h1.2
  text "19" at 2.025,1.774 h1.2
  text "12" at -3.975,1.774 h1.2
  text "14" at -3.725,-4.701 h1.2
  text "21" at 2.025,-4.701 h1.2
Bottom Overlay:
  text "7" at -8.8,-8.125 h1.2
  text "30" at 9.95,-8.125 h1.2
  text "4" at -8.65,0.949 h1.2
  text "27" at 9.875,0.974 h1.2
  text "24" at 10.175,27.899 h1.2
  text "9" at -8.775,-29.026 h1.2
  text "32" at 10.1,-29.026 h1.2
  text "21" at 3.75,-4.725 h1.2
  text "14" at -2.25,-4.675 h1.2
  text "12" at -2.35,1.774 h1.2
  text "19" at 3.675,1.774 h1.2
  text "10" at -2.025,26.099 h1.2
  text "17" at 3.975,26.099 h1.2
  text "23" at 3.9,-29.026 h1.2
  text "16" at -2.275,-29.026 h1.2
  text "1" at -8.664,27.75 h1.2
Mechanical 8:
  lines w0.1: -9.707,-23.974 -9.207,-23.974 ; -9.707,-17.974 -9.207,-17.974 ; -9.707,-11.974 -9.207,-11.974 ; -9.707,6.026 -9.207,6.026 ; -9.707,12.026 -9.207,12.026 ; -9.707,18.026 -9.207,18.026 ; -9.707,24.026 -9.207,24.026 ; -9.207,-24.474 -9.207,-23.974 ; -9.207,-23.474 -9.207,-23.974 ; -9.207,-18.474 -9.207,-17.974 ; -9.207,-17.474 -9.207,-17.974 ; -9.207,-12.474 -9.207,-11.974 ; -9.207,-11.474 -9.207,-11.974 ; -9.207,5.526 -9.207,6.026 ; -9.207,6.526 -9.207,6.026 ; -9.207,11.526 -9.207,12.026 ; -9.207,12.526 -9.207,12.026 ; -9.207,17.526 -9.207,18.026 ; -9.207,18.526 -9.207,18.026 ; -9.207,23.526 -9.207,24.026 ; -9.207,24.526 -9.207,24.026 ; -8.707,-23.974 -9.207,-23.974 ; -8.707,-17.974 -9.207,-17.974 ; -8.707,-11.974 -9.207,-11.974 ; -8.707,6.026 -9.207,6.026 ; -8.707,12.026 -9.207,12.026 ; -8.707,18.026 -9.207,18.026 ; -8.707,24.026 -9.207,24.026 ; -3.507,-23.974 -3.007,-23.974 ; -3.507,-16.274 -3.007,-16.274 ; -3.507,-8.574 -3.007,-8.574 ; -3.507,6.826 -3.007,6.826 ; -3.507,14.526 -3.007,14.526 ; -3.507,22.226 -3.007,22.226 ; -3.007,-24.474 -3.007,-23.974 ; -3.007,-23.474 -3.007,-23.974 ; -3.007,-16.774 -3.007,-16.274 ; -3.007,-15.774 -3.007,-16.274 ; -3.007,-9.074 -3.007,-8.574 ; -3.007,-8.074 -3.007,-8.574 ; -3.007,6.326 -3.007,6.826 ; -3.007,7.326 -3.007,6.826 ; -3.007,14.026 -3.007,14.526 ; -3.007,15.026 -3.007,14.526 ; -3.007,21.726 -3.007,22.226 ; -3.007,22.726 -3.007,22.226 ; -2.507,-23.974 -3.007,-23.974 ; -2.507,-16.274 -3.007,-16.274 ; -2.507,-8.574 -3.007,-8.574 ; -2.507,6.826 -3.007,6.826 ; -2.507,14.526 -3.007,14.526 ; -2.507,22.226 -3.007,22.226 ; -0.5,0 0,0 ; 0,-0.5 0,0 ; 0,0.5 0,0 ; 0.5,0 0,0 ; 2.493,-23.974 2.993,-23.974 ; 2.493,-16.274 2.993,-16.274 ; 2.493,-8.574 2.993,-8.574 ; 2.493,6.826 2.993,6.826 ; 2.493,14.526 2.993,14.526 ; 2.493,22.226 2.993,22.226 ; 2.993,-24.474 2.993,-23.974 ; 2.993,-23.474 2.993,-23.974 ; 2.993,-16.774 2.993,-16.274 ; 2.993,-15.774 2.993,-16.274 ; 2.993,-9.074 2.993,-8.574 ; 2.993,-8.074 2.993,-8.574 ; 2.993,6.326 2.993,6.826 ; 2.993,7.326 2.993,6.826 ; 2.993,14.026 2.993,14.526 ; 2.993,15.026 2.993,14.526 ; 2.993,21.726 2.993,22.226 ; 2.993,22.726 2.993,22.226 ; 3.493,-23.974 2.993,-23.974 ; 3.493,-16.274 2.993,-16.274 ; 3.493,-8.574 2.993,-8.574 ; 3.493,6.826 2.993,6.826 ; 3.493,14.526 2.993,14.526 ; 3.493,22.226 2.993,22.226 ; 8.693,-23.974 9.193,-23.974 ; 8.693,-17.974 9.193,-17.974 ; 8.693,-11.974 9.193,-11.974 ; 8.693,6.026 9.193,6.026 ; 8.693,12.026 9.193,12.026 ; 8.693,18.026 9.193,18.026 ; 8.693,24.026 9.193,24.026 ; 9.193,-24.474 9.193,-23.974 ; 9.193,-23.474 9.193,-23.974 ; 9.193,-18.474 9.193,-17.974 ; 9.193,-17.474 9.193,-17.974 ; 9.193,-12.474 9.193,-11.974 ; 9.193,-11.474 9.193,-11.974 ; 9.193,5.526 9.193,6.026 ; 9.193,6.526 9.193,6.026 ; 9.193,11.526 9.193,12.026 ; 9.193,12.526 9.193,12.026 ; 9.193,17.526 9.193,18.026 ; 9.193,18.526 9.193,18.026 ; 9.193,23.526 9.193,24.026 ; 9.193,24.526 9.193,24.026 ; 9.693,-23.974 9.193,-23.974 ; 9.693,-17.974 9.193,-17.974 ; 9.693,-11.974 9.193,-11.974 ; 9.693,6.026 9.193,6.026 ; 9.693,12.026 9.193,12.026 ; 9.693,18.026 9.193,18.026 ; 9.693,24.026 9.193,24.026
Mechanical 14:
  circle w0.1: c-9.207,12.026 r2.25
  circle w0.1: c-9.207,24.026 r2.25
  circle w0.1: c-9.207,24.026 r2.6
  circle w0.1: c-3.007,22.226 r2.25
  circle w0.1: c2.993,22.226 r2.25
  circle w0.1: c9.193,24.026 r2.25
  circle w0.1: c9.193,18.026 r2.25
  circle w0.1: c9.193,12.026 r2.25
  circle w0.1: c9.193,6.026 r2.25
  circle w0.1: c2.993,6.826 r2.25
  circle w0.1: c2.993,14.526 r2.25
  circle w0.1: c-3.007,14.526 r2.25
  circle w0.1: c-3.007,6.826 r2.25
  circle w0.1: c-9.207,6.026 r2.25
  circle w0.1: c2.993,-8.574 r2.25
  circle w0.1: c9.193,-11.974 r2.25
  circle w0.1: c9.193,-17.974 r2.25
  circle w0.1: c9.193,-23.974 r2.25
  circle w0.1: c2.993,-16.274 r2.25
  circle w0.1: c2.993,-23.974 r2.25
  circle w0.1: c-3.007,-23.974 r2.25
  circle w0.1: c-3.007,-16.274 r2.25
  circle w0.1: c-3.007,-8.574 r2.25
  circle w0.1: c-9.207,-11.974 r2.25
  circle w0.1: c-9.207,-17.974 r2.25
  circle w0.1: c-9.207,-23.974 r2.25
  circle w0.1: c-9.207,18.026 r2.25
  circle w0.1: c-9.207,18.026 r2.6
  circle w0.1: c-3.007,22.226 r2.6
  circle w0.1: c2.993,22.226 r2.6
  circle w0.1: c-3.007,14.526 r2.6
  circle w0.1: c2.993,14.526 r2.6
  circle w0.1: c-9.207,12.026 r2.6
  circle w0.1: c9.193,18.026 r2.6
  circle w0.1: c9.193,24.026 r2.6
  circle w0.1: c9.193,12.026 r2.6
  circle w0.1: c9.193,6.026 r2.6
  circle w0.1: c2.993,6.826 r2.6
  circle w0.1: c-3.007,6.826 r2.6
  circle w0.1: c-9.207,6.026 r2.6
  circle w0.1: c-3.007,-8.574 r2.6
  circle w0.1: c2.993,-8.574 r2.6
  circle w0.1: c-9.207,-11.974 r2.6
  circle w0.1: c-9.207,-17.974 r2.6
  circle w0.1: c-9.207,-23.974 r2.6
  circle w0.1: c-3.007,-23.974 r2.6
  circle w0.1: c-3.007,-16.274 r2.6
  circle w0.1: c2.993,-16.274 r2.6
  circle w0.1: c2.993,-23.974 r2.6
  circle w0.1: c9.193,-23.974 r2.6
  circle w0.1: c9.193,-17.974 r2.6
  circle w0.1: c9.193,-11.974 r2.6
  circle w0.1: c-14.2,30.2 r1
  lines w0.1: -16,-32 16,-32 16,32 -16,32 -16,-32
  text "7" at -9.575,-8.101 h1.2
  text "30" at 8.225,-8.101 h1.2
  text "4" at -9.525,0.974 h1.2
  text "27" at 8.225,0.974 h1.2
  text "24" at 8.225,27.899 h1.2
  text "9" at -9.525,-29.026 h1.2
  text "32" at 8.225,-29.026 h1.2
  text "1" at -9.525,27.75 h1.2
  text "16" at -3.975,-29.026 h1.2
  text "23" at 2.025,-29.026 h1.2
  text "17" at 2.025,26.099 h1.2
  text "10" at -3.975,26.099 h1.2
  text "19" at 2.025,1.774 h1.2
  text "12" at -3.975,1.774 h1.2
  text "14" at -3.725,-4.701 h1.2
  text "21" at 2.025,-4.701 h1.2
3D body "HARTING_09 33 000 9815.stp": height 26, standoff -4.6, extent -16,-32 16,32

## HARTING_09 33 000 9996 [mm] "6 Positions, PC Board Adaptor For Han E?Module"
height 23
pads (2):
  round 2.5 hole 1.8: 1(-3.75,0) 2(3.75,0)
Top Overlay:
  circle w0.2: c-3.75,0 r2.45
  circle w0.2: c-3.75,0 r2.25
  circle w0.2: c3.75,0 r2.45
  circle w0.2: c3.75,0 r2.25
  lines w0.2: -8.727,-4.285 cw(c-8.65,-4.1) -8.727,-3.915 ; -8.4,-3.35 -8.4,-3.466 ; -8.1,-3.35 -8.1,-3.661 ; -7.9,-3.35 -7.9,-3.661 ; -7.6,-3.35 -7.6,-3.466 ; -7.273,-4.285 ccw(c-7.35,-4.1) -7.273,-3.915 ; -6.45,3.35 -6.45,4.35 -1.75,4.35 -1.75,3.35 ; 1.75,3.35 1.75,4.35 6.45,4.35 6.45,3.35 ; 7.273,-4.285 cw(c7.35,-4.1) 7.273,-3.915 ; 7.6,-3.35 7.6,-3.466 ; 7.9,-3.35 7.9,-3.661 ; 8.1,-3.35 8.1,-3.661 ; 8.4,-3.35 8.4,-3.466 ; 8.727,-4.285 ccw(c8.65,-4.1) 8.727,-3.915 ; -8.4,-3.466 ccw(c-8,-4.1) -7.6,-3.466 ; -8.4,-3.466 cw(c-9.479,-5.447) -8.1,-3.661 ; -8.1,-3.661 ccw(c-8,-4.1) -7.9,-3.661 ; -7.9,-3.661 cw(c-6.785,-5.043) -7.6,-3.466 ; 7.6,-3.466 ccw(c8,-4.1) 8.4,-3.466 ; 7.6,-3.466 cw(c6.785,-5.043) 7.9,-3.661 ; 7.9,-3.661 ccw(c8,-4.1) 8.1,-3.661 ; 8.1,-3.661 cw(c9.479,-5.447) 8.4,-3.466 ; -13,-3.35 13,-3.35 13,3.35 -13,3.35 -13,-3.35
  text "1" at -7.3,-0.6 h1.2
Mechanical 8:
  lines w0.1: -4.25,0 -3.75,0 ; -3.75,-0.5 -3.75,0 ; -3.75,0.5 -3.75,0 ; -3.25,0 -3.75,0 ; -0.5,0 0,0 ; 0,-0.5 0,0 ; 0,0.5 0,0 ; 0.5,0 0,0 ; 3.25,0 3.75,0 ; 3.75,-0.5 3.75,0 ; 3.75,0.5 3.75,0 ; 4.25,0 3.75,0
Mechanical 14:
  circle w0.1: c-3.75,0 r1.25
  circle w0.1: c-3.75,0 r2.45
  circle w0.1: c-3.75,0 r2.25
  circle w0.1: c-3.75,0 r1.35
  circle w0.1: c3.75,0 r1.25
  circle w0.1: c3.75,0 r2.45
  circle w0.1: c3.75,0 r2.25
  circle w0.1: c3.75,0 r1.35
  lines w0.1: -8.727,-4.285 cw(c-8.65,-4.1) -8.727,-3.915 ; -8.4,-3.35 -8.4,-3.466 ; -8.1,-3.35 -8.1,-3.661 ; -7.9,-3.35 -7.9,-3.661 ; -7.6,-3.35 -7.6,-3.466 ; -7.273,-4.285 ccw(c-7.35,-4.1) -7.273,-3.915 ; -6.45,3.35 -6.45,4.35 -1.75,4.35 -1.75,3.35 ; 1.75,3.35 1.75,4.35 6.45,4.35 6.45,3.35 ; 7.273,-4.285 cw(c7.35,-4.1) 7.273,-3.915 ; 7.6,-3.35 7.6,-3.466 ; 7.9,-3.35 7.9,-3.661 ; 8.1,-3.35 8.1,-3.661 ; 8.4,-3.35 8.4,-3.466 ; 8.727,-4.285 ccw(c8.65,-4.1) 8.727,-3.915 ; -8.4,-3.466 ccw(c-8,-4.1) -7.6,-3.466 ; -8.4,-3.466 cw(c-9.479,-5.447) -8.1,-3.661 ; -8.1,-3.661 ccw(c-8,-4.1) -7.9,-3.661 ; -7.9,-3.661 cw(c-6.785,-5.043) -7.6,-3.466 ; 7.6,-3.466 ccw(c8,-4.1) 8.4,-3.466 ; 7.6,-3.466 cw(c6.785,-5.043) 7.9,-3.661 ; 7.9,-3.661 ccw(c8,-4.1) 8.1,-3.661 ; 8.1,-3.661 cw(c9.479,-5.447) 8.4,-3.466 ; -13,-3.35 13,-3.35 13,3.35 -13,3.35 -13,-3.35
  text "1" at -7.3,-0.6 h1.2
3D body "HARTING_09 33 000 9996.stp": height 23, standoff -4.6, extent -13,-4.85 13,4.35

## HARWIN_M1353-98 [mm] "PC Board Test Jack for ?.03mm Probe"
height 5.16
pads (2):
  round 2.2 hole 1.5: 1(-5.08,0) 1(5.08,0)
Top Overlay:
  lines w0.2: -5.88,-1.269 -5.88,-2.105 5.88,-2.105 5.88,-1.269 ; -5.88,1.269 -5.88,2.105 5.88,2.105 5.88,1.269
Mechanical 8:
  lines w0.1: -5.58,0 -5.08,0 ; -5.08,-0.5 -5.08,0 ; -5.08,0.5 -5.08,0 ; -4.58,0 -5.08,0 ; -0.5,0 0,0 ; 0,-0.5 0,0 ; 0,0.5 0,0 ; 0.5,0 0,0 ; 4.58,0 5.08,0 ; 5.08,-0.5 5.08,0 ; 5.08,0.5 5.08,0 ; 5.58,0 5.08,0
Mechanical 14:
  lines w0.1: -5.88,-2.105 5.88,-2.105 5.88,2.105 -5.88,2.105 -5.88,-2.105
3D body "HARWIN_M1353-98.stp": height 5.16, standoff -2.79, extent -5.88,-2.105 5.88,2.105